# Altium footprint library ST封装.PcbLib: 1336 footprints (part 83 of 109)
Each footprint in its own frame and in the unit in brackets; x right, y up, seen from the top. Pads: shape width x height; smd on the part's side, far side on the other; paste and mask are expansions set on the pad; w line width, h text height; cw(c..) or ccw(c..) is an arc to the next point about the centre after c.
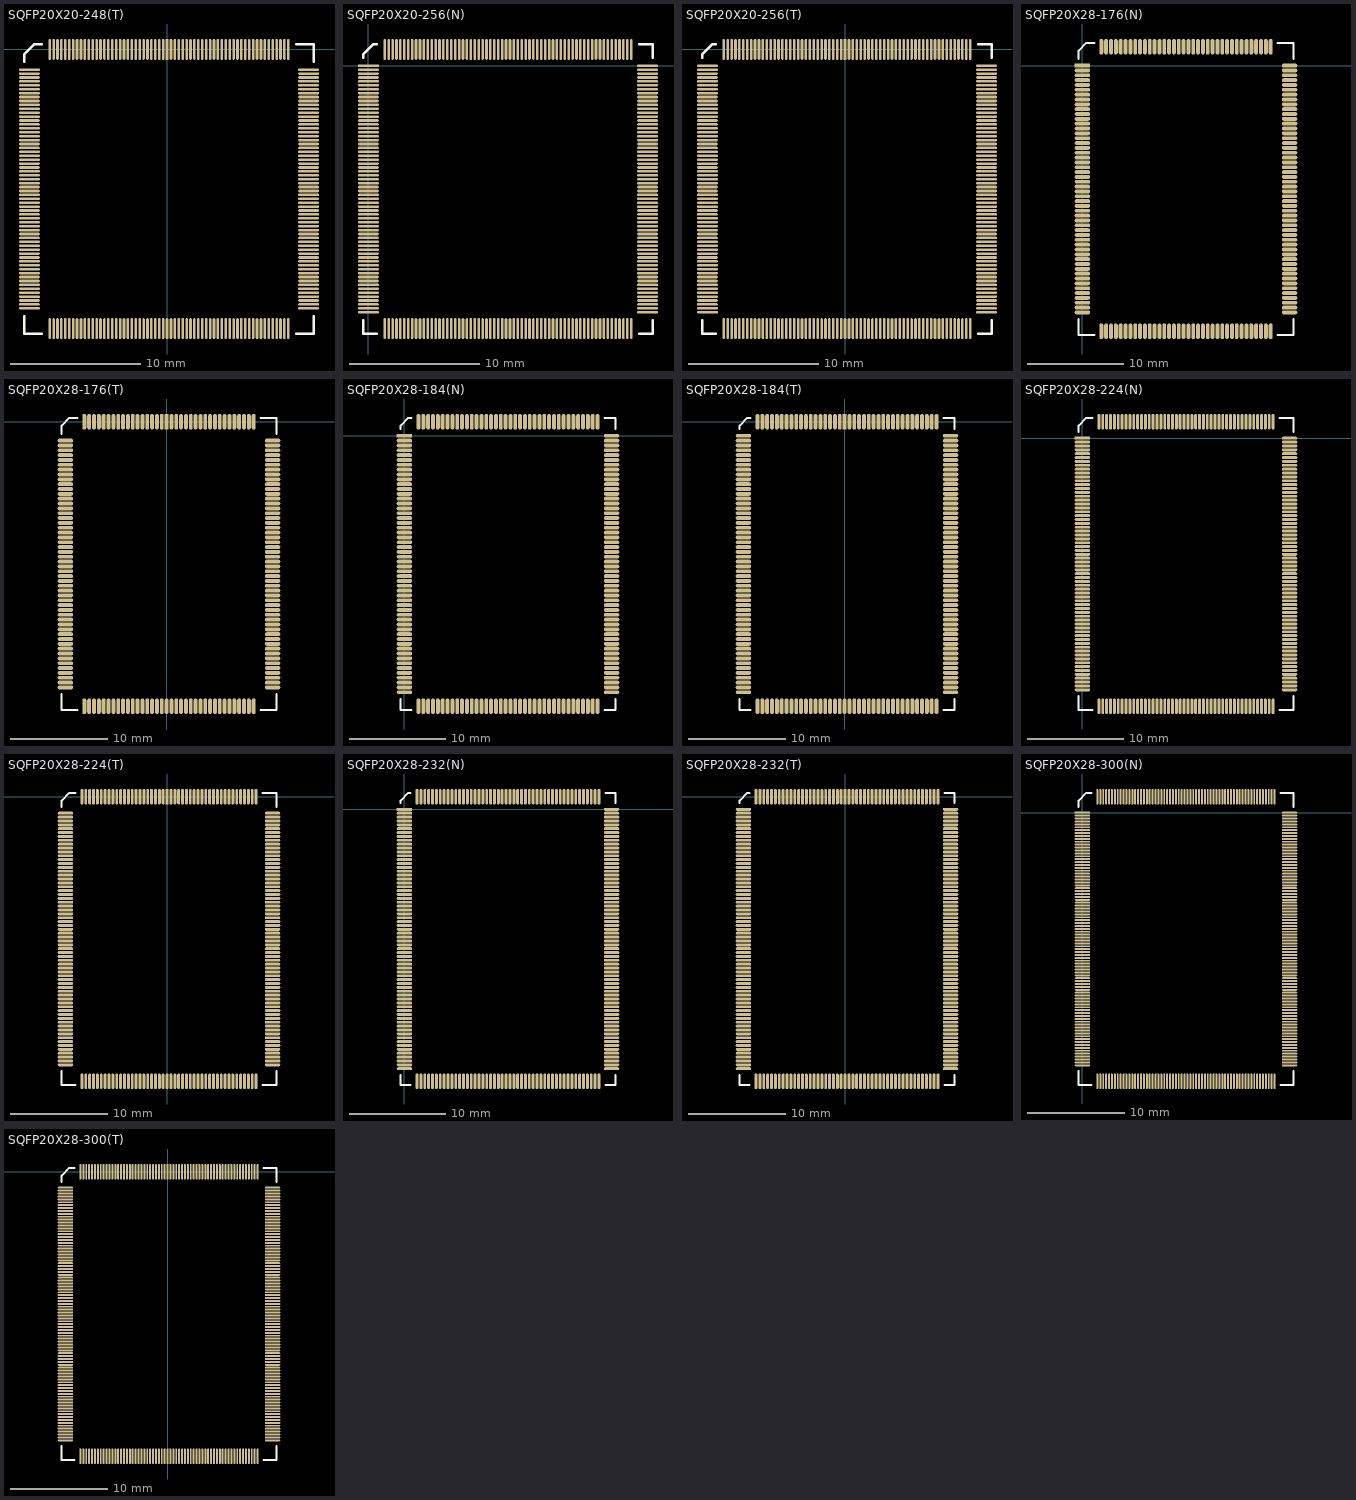
[diagram p82: the footprints below, top view; thin cyan lines are the x and y axes]

## SQFP20X20-248(T) [mm]
pads (248):
  rect 0.2x1.6 smd: 1(0,0)
  oval 0.2x1.6 smd: 2(-0.3,0) 3(-0.6,0) 4(-0.9,0) 5(-1.2,0) 6(-1.5,0) 7(-1.8,0) 8(-2.1,0) 9(-2.4,0) 10(-2.7,0) 11(-3,0) 12(-3.3,0) 13(-3.6,0) 14(-3.9,0) 15(-4.2,0) 16(-4.5,0) 17(-4.8,0) 18(-5.1,0) 19(-5.4,0) 20(-5.7,0) 21(-6,0) 22(-6.3,0) 23(-6.6,0) 24(-6.9,0) 25(-7.2,0) 26(-7.5,0) 27(-7.8,0) 28(-8.1,0) 29(-8.4,0) 30(-8.7,0) 31(-9,0) 94(-9,-21.4) 95(-8.7,-21.4) 96(-8.4,-21.4) 97(-8.1,-21.4) 98(-7.8,-21.4) 99(-7.5,-21.4) 100(-7.2,-21.4) 101(-6.9,-21.4) 102(-6.6,-21.4) 103(-6.3,-21.4) 104(-6,-21.4) 105(-5.7,-21.4) 106(-5.4,-21.4) 107(-5.1,-21.4) 108(-4.8,-21.4) 109(-4.5,-21.4) 110(-4.2,-21.4) 111(-3.9,-21.4) 112(-3.6,-21.4) 113(-3.3,-21.4) 114(-3,-21.4) 115(-2.7,-21.4) 116(-2.4,-21.4) 117(-2.1,-21.4) 118(-1.8,-21.4) 119(-1.5,-21.4) 120(-1.2,-21.4) 121(-0.9,-21.4) 122(-0.6,-21.4) 123(-0.3,-21.4) 124(0,-21.4) 125(0.3,-21.4) 126(0.6,-21.4) 127(0.9,-21.4) 128(1.2,-21.4) 129(1.5,-21.4) 130(1.8,-21.4) 131(2.1,-21.4) 132(2.4,-21.4) 133(2.7,-21.4) 134(3,-21.4) 135(3.3,-21.4) 136(3.6,-21.4) 137(3.9,-21.4) 138(4.2,-21.4) 139(4.5,-21.4) 140(4.8,-21.4) 141(5.1,-21.4) 142(5.4,-21.4) 143(5.7,-21.4) 144(6,-21.4) 145(6.3,-21.4) 146(6.6,-21.4) 147(6.9,-21.4) 148(7.2,-21.4) 149(7.5,-21.4) 150(7.8,-21.4) 151(8.1,-21.4) 152(8.4,-21.4) 153(8.7,-21.4) 154(9,-21.4) 155(9.3,-21.4) 218(9.3,0) 219(9,0) 220(8.7,0) 221(8.4,0) 222(8.1,0) 223(7.8,0) 224(7.5,0) 225(7.2,0) 226(6.9,0) 227(6.6,0) 228(6.3,0) 229(6,0) 230(5.7,0) 231(5.4,0) 232(5.1,0) 233(4.8,0) 234(4.5,0) 235(4.2,0) 236(3.9,0) 237(3.6,0) 238(3.3,0) 239(3,0) 240(2.7,0) 241(2.4,0) 242(2.1,0) 243(1.8,0) 244(1.5,0) 245(1.2,0) 246(0.9,0) 247(0.6,0) 248(0.3,0)
  oval 1.6x0.2 smd: 32(-10.55,-1.55) 33(-10.55,-1.85) 34(-10.55,-2.15) 35(-10.55,-2.45) 36(-10.55,-2.75) 37(-10.55,-3.05) 38(-10.55,-3.35) 39(-10.55,-3.65) 40(-10.55,-3.95) 41(-10.55,-4.25) 42(-10.55,-4.55) 43(-10.55,-4.85) 44(-10.55,-5.15) 45(-10.55,-5.45) 46(-10.55,-5.75) 47(-10.55,-6.05) 48(-10.55,-6.35) 49(-10.55,-6.65) 50(-10.55,-6.95) 51(-10.55,-7.25) 52(-10.55,-7.55) 53(-10.55,-7.85) 54(-10.55,-8.15) 55(-10.55,-8.45) 56(-10.55,-8.75) 57(-10.55,-9.05) 58(-10.55,-9.35) 59(-10.55,-9.65) 60(-10.55,-9.95) 61(-10.55,-10.25) 62(-10.55,-10.55) 63(-10.55,-10.85) 64(-10.55,-11.15) 65(-10.55,-11.45) 66(-10.55,-11.75) 67(-10.55,-12.05) 68(-10.55,-12.35) 69(-10.55,-12.65) 70(-10.55,-12.95) 71(-10.55,-13.25) 72(-10.55,-13.55) 73(-10.55,-13.85) 74(-10.55,-14.15) 75(-10.55,-14.45) 76(-10.55,-14.75) 77(-10.55,-15.05) 78(-10.55,-15.35) 79(-10.55,-15.65) 80(-10.55,-15.95) 81(-10.55,-16.25) 82(-10.55,-16.55) 83(-10.55,-16.85) 84(-10.55,-17.15) 85(-10.55,-17.45) 86(-10.55,-17.75) 87(-10.55,-18.05) 88(-10.55,-18.35) 89(-10.55,-18.65) 90(-10.55,-18.95) 91(-10.55,-19.25) 92(-10.55,-19.55) 93(-10.55,-19.85) 156(10.85,-19.85) 157(10.85,-19.55) 158(10.85,-19.25) 159(10.85,-18.95) 160(10.85,-18.65) 161(10.85,-18.35) 162(10.85,-18.05) 163(10.85,-17.75) 164(10.85,-17.45) 165(10.85,-17.15) 166(10.85,-16.85) 167(10.85,-16.55) 168(10.85,-16.25) 169(10.85,-15.95) 170(10.85,-15.65) 171(10.85,-15.35) 172(10.85,-15.05) 173(10.85,-14.75) 174(10.85,-14.45) 175(10.85,-14.15) 176(10.85,-13.85) 177(10.85,-13.55) 178(10.85,-13.25) 179(10.85,-12.95) 180(10.85,-12.65) 181(10.85,-12.35) 182(10.85,-12.05) 183(10.85,-11.75) 184(10.85,-11.45) 185(10.85,-11.15) 186(10.85,-10.85) 187(10.85,-10.55) 188(10.85,-10.25) 189(10.85,-9.95) 190(10.85,-9.65) 191(10.85,-9.35) 192(10.85,-9.05) 193(10.85,-8.75) 194(10.85,-8.45) 195(10.85,-8.15) 196(10.85,-7.85) 197(10.85,-7.55) 198(10.85,-7.25) 199(10.85,-6.95) 200(10.85,-6.65) 201(10.85,-6.35) 202(10.85,-6.05) 203(10.85,-5.75) 204(10.85,-5.45) 205(10.85,-5.15) 206(10.85,-4.85) 207(10.85,-4.55) 208(10.85,-4.25) 209(10.85,-3.95) 210(10.85,-3.65) 211(10.85,-3.35) 212(10.85,-3.05) 213(10.85,-2.75) 214(10.85,-2.45) 215(10.85,-2.15) 216(10.85,-1.85) 217(10.85,-1.55)
Top Overlay:
  lines w0.2: -10.95,-20.45 -10.95,-21.8 -9.6,-21.8 ; -10.95,-0.95 -10.95,-0.4 -10.15,0.4 -9.6,0.4 ; 9.9,-21.8 11.25,-21.8 11.25,-20.45 ; 9.9,0.4 11.25,0.4 11.25,-0.95

## SQFP20X20-256(N) [mm]
pads (256):
  rect 1.6x0.2 smd: 1(0,0)
  oval 1.6x0.2 smd: 2(0,-0.3) 3(0,-0.6) 4(0,-0.9) 5(0,-1.2) 6(0,-1.5) 7(0,-1.8) 8(0,-2.1) 9(0,-2.4) 10(0,-2.7) 11(0,-3) 12(0,-3.3) 13(0,-3.6) 14(0,-3.9) 15(0,-4.2) 16(0,-4.5) 17(0,-4.8) 18(0,-5.1) 19(0,-5.4) 20(0,-5.7) 21(0,-6) 22(0,-6.3) 23(0,-6.6) 24(0,-6.9) 25(0,-7.2) 26(0,-7.5) 27(0,-7.8) 28(0,-8.1) 29(0,-8.4) 30(0,-8.7) 31(0,-9) 32(0,-9.3) 33(0,-9.6) 34(0,-9.9) 35(0,-10.2) 36(0,-10.5) 37(0,-10.8) 38(0,-11.1) 39(0,-11.4) 40(0,-11.7) 41(0,-12) 42(0,-12.3) 43(0,-12.6) 44(0,-12.9) 45(0,-13.2) 46(0,-13.5) 47(0,-13.8) 48(0,-14.1) 49(0,-14.4) 50(0,-14.7) 51(0,-15) 52(0,-15.3) 53(0,-15.6) 54(0,-15.9) 55(0,-16.2) 56(0,-16.5) 57(0,-16.8) 58(0,-17.1) 59(0,-17.4) 60(0,-17.7) 61(0,-18) 62(0,-18.3) 63(0,-18.6) 64(0,-18.9) 129(21.4,-18.9) 130(21.4,-18.6) 131(21.4,-18.3) 132(21.4,-18) 133(21.4,-17.7) 134(21.4,-17.4) 135(21.4,-17.1) 136(21.4,-16.8) 137(21.4,-16.5) 138(21.4,-16.2) 139(21.4,-15.9) 140(21.4,-15.6) 141(21.4,-15.3) 142(21.4,-15) 143(21.4,-14.7) 144(21.4,-14.4) 145(21.4,-14.1) 146(21.4,-13.8) 147(21.4,-13.5) 148(21.4,-13.2) 149(21.4,-12.9) 150(21.4,-12.6) 151(21.4,-12.3) 152(21.4,-12) 153(21.4,-11.7) 154(21.4,-11.4) 155(21.4,-11.1) 156(21.4,-10.8) 157(21.4,-10.5) 158(21.4,-10.2) 159(21.4,-9.9) 160(21.4,-9.6) 161(21.4,-9.3) 162(21.4,-9) 163(21.4,-8.7) 164(21.4,-8.4) 165(21.4,-8.1) 166(21.4,-7.8) 167(21.4,-7.5) 168(21.4,-7.2) 169(21.4,-6.9) 170(21.4,-6.6) 171(21.4,-6.3) 172(21.4,-6) 173(21.4,-5.7) 174(21.4,-5.4) 175(21.4,-5.1) 176(21.4,-4.8) 177(21.4,-4.5) 178(21.4,-4.2) 179(21.4,-3.9) 180(21.4,-3.6) 181(21.4,-3.3) 182(21.4,-3) 183(21.4,-2.7) 184(21.4,-2.4) 185(21.4,-2.1) 186(21.4,-1.8) 187(21.4,-1.5) 188(21.4,-1.2) 189(21.4,-0.9) 190(21.4,-0.6) 191(21.4,-0.3) 192(21.4,0)
  oval 0.2x1.6 smd: 65(1.25,-20.15) 66(1.55,-20.15) 67(1.85,-20.15) 68(2.15,-20.15) 69(2.45,-20.15) 70(2.75,-20.15) 71(3.05,-20.15) 72(3.35,-20.15) 73(3.65,-20.15) 74(3.95,-20.15) 75(4.25,-20.15) 76(4.55,-20.15) 77(4.85,-20.15) 78(5.15,-20.15) 79(5.45,-20.15) 80(5.75,-20.15) 81(6.05,-20.15) 82(6.35,-20.15) 83(6.65,-20.15) 84(6.95,-20.15) 85(7.25,-20.15) 86(7.55,-20.15) 87(7.85,-20.15) 88(8.15,-20.15) 89(8.45,-20.15) 90(8.75,-20.15) 91(9.05,-20.15) 92(9.35,-20.15) 93(9.65,-20.15) 94(9.95,-20.15) 95(10.25,-20.15) 96(10.55,-20.15) 97(10.85,-20.15) 98(11.15,-20.15) 99(11.45,-20.15) 100(11.75,-20.15) 101(12.05,-20.15) 102(12.35,-20.15) 103(12.65,-20.15) 104(12.95,-20.15) 105(13.25,-20.15) 106(13.55,-20.15) 107(13.85,-20.15) 108(14.15,-20.15) 109(14.45,-20.15) 110(14.75,-20.15) 111(15.05,-20.15) 112(15.35,-20.15) 113(15.65,-20.15) 114(15.95,-20.15) 115(16.25,-20.15) 116(16.55,-20.15) 117(16.85,-20.15) 118(17.15,-20.15) 119(17.45,-20.15) 120(17.75,-20.15) 121(18.05,-20.15) 122(18.35,-20.15) 123(18.65,-20.15) 124(18.95,-20.15) 125(19.25,-20.15) 126(19.55,-20.15) 127(19.85,-20.15) 128(20.15,-20.15) 193(20.15,1.25) 194(19.85,1.25) 195(19.55,1.25) 196(19.25,1.25) 197(18.95,1.25) 198(18.65,1.25) 199(18.35,1.25) 200(18.05,1.25) 201(17.75,1.25) 202(17.45,1.25) 203(17.15,1.25) 204(16.85,1.25) 205(16.55,1.25) 206(16.25,1.25) 207(15.95,1.25) 208(15.65,1.25) 209(15.35,1.25) 210(15.05,1.25) 211(14.75,1.25) 212(14.45,1.25) 213(14.15,1.25) 214(13.85,1.25) 215(13.55,1.25) 216(13.25,1.25) 217(12.95,1.25) 218(12.65,1.25) 219(12.35,1.25) 220(12.05,1.25) 221(11.75,1.25) 222(11.45,1.25) 223(11.15,1.25) 224(10.85,1.25) 225(10.55,1.25) 226(10.25,1.25) 227(9.95,1.25) 228(9.65,1.25) 229(9.35,1.25) 230(9.05,1.25) 231(8.75,1.25) 232(8.45,1.25) 233(8.15,1.25) 234(7.85,1.25) 235(7.55,1.25) 236(7.25,1.25) 237(6.95,1.25) 238(6.65,1.25) 239(6.35,1.25) 240(6.05,1.25) 241(5.75,1.25) 242(5.45,1.25) 243(5.15,1.25) 244(4.85,1.25) 245(4.55,1.25) 246(4.25,1.25) 247(3.95,1.25) 248(3.65,1.25) 249(3.35,1.25) 250(3.05,1.25) 251(2.75,1.25) 252(2.45,1.25) 253(2.15,1.25) 254(1.85,1.25) 255(1.55,1.25) 256(1.25,1.25)
Top Overlay:
  lines w0.2: -0.4,-19.5 -0.4,-20.55 0.65,-20.55 ; -0.4,0.6 -0.4,0.85 0.4,1.65 0.65,1.65 ; 20.75,-20.55 21.8,-20.55 21.8,-19.5 ; 20.75,1.65 21.8,1.65 21.8,0.6

## SQFP20X20-256(T) [mm]
pads (256):
  rect 0.2x1.6 smd: 1(0,0)
  oval 0.2x1.6 smd: 2(-0.3,0) 3(-0.6,0) 4(-0.9,0) 5(-1.2,0) 6(-1.5,0) 7(-1.8,0) 8(-2.1,0) 9(-2.4,0) 10(-2.7,0) 11(-3,0) 12(-3.3,0) 13(-3.6,0) 14(-3.9,0) 15(-4.2,0) 16(-4.5,0) 17(-4.8,0) 18(-5.1,0) 19(-5.4,0) 20(-5.7,0) 21(-6,0) 22(-6.3,0) 23(-6.6,0) 24(-6.9,0) 25(-7.2,0) 26(-7.5,0) 27(-7.8,0) 28(-8.1,0) 29(-8.4,0) 30(-8.7,0) 31(-9,0) 32(-9.3,0) 97(-9.3,-21.4) 98(-9,-21.4) 99(-8.7,-21.4) 100(-8.4,-21.4) 101(-8.1,-21.4) 102(-7.8,-21.4) 103(-7.5,-21.4) 104(-7.2,-21.4) 105(-6.9,-21.4) 106(-6.6,-21.4) 107(-6.3,-21.4) 108(-6,-21.4) 109(-5.7,-21.4) 110(-5.4,-21.4) 111(-5.1,-21.4) 112(-4.8,-21.4) 113(-4.5,-21.4) 114(-4.2,-21.4) 115(-3.9,-21.4) 116(-3.6,-21.4) 117(-3.3,-21.4) 118(-3,-21.4) 119(-2.7,-21.4) 120(-2.4,-21.4) 121(-2.1,-21.4) 122(-1.8,-21.4) 123(-1.5,-21.4) 124(-1.2,-21.4) 125(-0.9,-21.4) 126(-0.6,-21.4) 127(-0.3,-21.4) 128(0,-21.4) 129(0.3,-21.4) 130(0.6,-21.4) 131(0.9,-21.4) 132(1.2,-21.4) 133(1.5,-21.4) 134(1.8,-21.4) 135(2.1,-21.4) 136(2.4,-21.4) 137(2.7,-21.4) 138(3,-21.4) 139(3.3,-21.4) 140(3.6,-21.4) 141(3.9,-21.4) 142(4.2,-21.4) 143(4.5,-21.4) 144(4.8,-21.4) 145(5.1,-21.4) 146(5.4,-21.4) 147(5.7,-21.4) 148(6,-21.4) 149(6.3,-21.4) 150(6.6,-21.4) 151(6.9,-21.4) 152(7.2,-21.4) 153(7.5,-21.4) 154(7.8,-21.4) 155(8.1,-21.4) 156(8.4,-21.4) 157(8.7,-21.4) 158(9,-21.4) 159(9.3,-21.4) 160(9.6,-21.4) 225(9.6,0) 226(9.3,0) 227(9,0) 228(8.7,0) 229(8.4,0) 230(8.1,0) 231(7.8,0) 232(7.5,0) 233(7.2,0) 234(6.9,0) 235(6.6,0) 236(6.3,0) 237(6,0) 238(5.7,0) 239(5.4,0) 240(5.1,0) 241(4.8,0) 242(4.5,0) 243(4.2,0) 244(3.9,0) 245(3.6,0) 246(3.3,0) 247(3,0) 248(2.7,0) 249(2.4,0) 250(2.1,0) 251(1.8,0) 252(1.5,0) 253(1.2,0) 254(0.9,0) 255(0.6,0) 256(0.3,0)
  oval 1.6x0.2 smd: 33(-10.55,-1.25) 34(-10.55,-1.55) 35(-10.55,-1.85) 36(-10.55,-2.15) 37(-10.55,-2.45) 38(-10.55,-2.75) 39(-10.55,-3.05) 40(-10.55,-3.35) 41(-10.55,-3.65) 42(-10.55,-3.95) 43(-10.55,-4.25) 44(-10.55,-4.55) 45(-10.55,-4.85) 46(-10.55,-5.15) 47(-10.55,-5.45) 48(-10.55,-5.75) 49(-10.55,-6.05) 50(-10.55,-6.35) 51(-10.55,-6.65) 52(-10.55,-6.95) 53(-10.55,-7.25) 54(-10.55,-7.55) 55(-10.55,-7.85) 56(-10.55,-8.15) 57(-10.55,-8.45) 58(-10.55,-8.75) 59(-10.55,-9.05) 60(-10.55,-9.35) 61(-10.55,-9.65) 62(-10.55,-9.95) 63(-10.55,-10.25) 64(-10.55,-10.55) 65(-10.55,-10.85) 66(-10.55,-11.15) 67(-10.55,-11.45) 68(-10.55,-11.75) 69(-10.55,-12.05) 70(-10.55,-12.35) 71(-10.55,-12.65) 72(-10.55,-12.95) 73(-10.55,-13.25) 74(-10.55,-13.55) 75(-10.55,-13.85) 76(-10.55,-14.15) 77(-10.55,-14.45) 78(-10.55,-14.75) 79(-10.55,-15.05) 80(-10.55,-15.35) 81(-10.55,-15.65) 82(-10.55,-15.95) 83(-10.55,-16.25) 84(-10.55,-16.55) 85(-10.55,-16.85) 86(-10.55,-17.15) 87(-10.55,-17.45) 88(-10.55,-17.75) 89(-10.55,-18.05) 90(-10.55,-18.35) 91(-10.55,-18.65) 92(-10.55,-18.95) 93(-10.55,-19.25) 94(-10.55,-19.55) 95(-10.55,-19.85) 96(-10.55,-20.15) 161(10.85,-20.15) 162(10.85,-19.85) 163(10.85,-19.55) 164(10.85,-19.25) 165(10.85,-18.95) 166(10.85,-18.65) 167(10.85,-18.35) 168(10.85,-18.05) 169(10.85,-17.75) 170(10.85,-17.45) 171(10.85,-17.15) 172(10.85,-16.85) 173(10.85,-16.55) 174(10.85,-16.25) 175(10.85,-15.95) 176(10.85,-15.65) 177(10.85,-15.35) 178(10.85,-15.05) 179(10.85,-14.75) 180(10.85,-14.45) 181(10.85,-14.15) 182(10.85,-13.85) 183(10.85,-13.55) 184(10.85,-13.25) 185(10.85,-12.95) 186(10.85,-12.65) 187(10.85,-12.35) 188(10.85,-12.05) 189(10.85,-11.75) 190(10.85,-11.45) 191(10.85,-11.15) 192(10.85,-10.85) 193(10.85,-10.55) 194(10.85,-10.25) 195(10.85,-9.95) 196(10.85,-9.65) 197(10.85,-9.35) 198(10.85,-9.05) 199(10.85,-8.75) 200(10.85,-8.45) 201(10.85,-8.15) 202(10.85,-7.85) 203(10.85,-7.55) 204(10.85,-7.25) 205(10.85,-6.95) 206(10.85,-6.65) 207(10.85,-6.35) 208(10.85,-6.05) 209(10.85,-5.75) 210(10.85,-5.45) 211(10.85,-5.15) 212(10.85,-4.85) 213(10.85,-4.55) 214(10.85,-4.25) 215(10.85,-3.95) 216(10.85,-3.65) 217(10.85,-3.35) 218(10.85,-3.05) 219(10.85,-2.75) 220(10.85,-2.45) 221(10.85,-2.15) 222(10.85,-1.85) 223(10.85,-1.55) 224(10.85,-1.25)
Top Overlay:
  lines w0.2: -10.95,-20.75 -10.95,-21.8 -9.9,-21.8 ; -10.95,-0.65 -10.95,-0.4 -10.15,0.4 -9.9,0.4 ; 10.2,-21.8 11.25,-21.8 11.25,-20.75 ; 10.2,0.4 11.25,0.4 11.25,-0.65

## SQFP20X28-176(N) [mm]
pads (176):
  rect 1.6x0.4 smd: 1(0,0)
  oval 1.6x0.4 smd: 2(0,-0.5) 3(0,-1) 4(0,-1.5) 5(0,-2) 6(0,-2.5) 7(0,-3) 8(0,-3.5) 9(0,-4) 10(0,-4.5) 11(0,-5) 12(0,-5.5) 13(0,-6) 14(0,-6.5) 15(0,-7) 16(0,-7.5) 17(0,-8) 18(0,-8.5) 19(0,-9) 20(0,-9.5) 21(0,-10) 22(0,-10.5) 23(0,-11) 24(0,-11.5) 25(0,-12) 26(0,-12.5) 27(0,-13) 28(0,-13.5) 29(0,-14) 30(0,-14.5) 31(0,-15) 32(0,-15.5) 33(0,-16) 34(0,-16.5) 35(0,-17) 36(0,-17.5) 37(0,-18) 38(0,-18.5) 39(0,-19) 40(0,-19.5) 41(0,-20) 42(0,-20.5) 43(0,-21) 44(0,-21.5) 45(0,-22) 46(0,-22.5) 47(0,-23) 48(0,-23.5) 49(0,-24) 50(0,-24.5) 51(0,-25) 52(0,-25.5) 89(21.4,-25.5) 90(21.4,-25) 91(21.4,-24.5) 92(21.4,-24) 93(21.4,-23.5) 94(21.4,-23) 95(21.4,-22.5) 96(21.4,-22) 97(21.4,-21.5) 98(21.4,-21) 99(21.4,-20.5) 100(21.4,-20) 101(21.4,-19.5) 102(21.4,-19) 103(21.4,-18.5) 104(21.4,-18) 105(21.4,-17.5) 106(21.4,-17) 107(21.4,-16.5) 108(21.4,-16) 109(21.4,-15.5) 110(21.4,-15) 111(21.4,-14.5) 112(21.4,-14) 113(21.4,-13.5) 114(21.4,-13) 115(21.4,-12.5) 116(21.4,-12) 117(21.4,-11.5) 118(21.4,-11) 119(21.4,-10.5) 120(21.4,-10) 121(21.4,-9.5) 122(21.4,-9) 123(21.4,-8.5) 124(21.4,-8) 125(21.4,-7.5) 126(21.4,-7) 127(21.4,-6.5) 128(21.4,-6) 129(21.4,-5.5) 130(21.4,-5) 131(21.4,-4.5) 132(21.4,-4) 133(21.4,-3.5) 134(21.4,-3) 135(21.4,-2.5) 136(21.4,-2) 137(21.4,-1.5) 138(21.4,-1) 139(21.4,-0.5) 140(21.4,0)
  oval 0.4x1.6 smd: 53(1.95,-27.45) 54(2.45,-27.45) 55(2.95,-27.45) 56(3.45,-27.45) 57(3.95,-27.45) 58(4.45,-27.45) 59(4.95,-27.45) 60(5.45,-27.45) 61(5.95,-27.45) 62(6.45,-27.45) 63(6.95,-27.45) 64(7.45,-27.45) 65(7.95,-27.45) 66(8.45,-27.45) 67(8.95,-27.45) 68(9.45,-27.45) 69(9.95,-27.45) 70(10.45,-27.45) 71(10.95,-27.45) 72(11.45,-27.45) 73(11.95,-27.45) 74(12.45,-27.45) 75(12.95,-27.45) 76(13.45,-27.45) 77(13.95,-27.45) 78(14.45,-27.45) 79(14.95,-27.45) 80(15.45,-27.45) 81(15.95,-27.45) 82(16.45,-27.45) 83(16.95,-27.45) 84(17.45,-27.45) 85(17.95,-27.45) 86(18.45,-27.45) 87(18.95,-27.45) 88(19.45,-27.45) 141(19.45,1.95) 142(18.95,1.95) 143(18.45,1.95) 144(17.95,1.95) 145(17.45,1.95) 146(16.95,1.95) 147(16.45,1.95) 148(15.95,1.95) 149(15.45,1.95) 150(14.95,1.95) 151(14.45,1.95) 152(13.95,1.95) 153(13.45,1.95) 154(12.95,1.95) 155(12.45,1.95) 156(11.95,1.95) 157(11.45,1.95) 158(10.95,1.95) 159(10.45,1.95) 160(9.95,1.95) 161(9.45,1.95) 162(8.95,1.95) 163(8.45,1.95) 164(7.95,1.95) 165(7.45,1.95) 166(6.95,1.95) 167(6.45,1.95) 168(5.95,1.95) 169(5.45,1.95) 170(4.95,1.95) 171(4.45,1.95) 172(3.95,1.95) 173(3.45,1.95) 174(2.95,1.95) 175(2.45,1.95) 176(1.95,1.95)
Top Overlay:
  lines w0.2: -0.4,-26.2 -0.4,-27.85 1.25,-27.85 ; -0.4,0.7 -0.4,1.55 0.4,2.35 1.25,2.35 ; 20.15,-27.85 21.8,-27.85 21.8,-26.2 ; 20.15,2.35 21.8,2.35 21.8,0.7

## SQFP20X28-176(T) [mm]
pads (176):
  rect 0.4x1.6 smd: 1(0,0)
  oval 0.4x1.6 smd: 2(-0.5,0) 3(-1,0) 4(-1.5,0) 5(-2,0) 6(-2.5,0) 7(-3,0) 8(-3.5,0) 9(-4,0) 10(-4.5,0) 11(-5,0) 12(-5.5,0) 13(-6,0) 14(-6.5,0) 15(-7,0) 16(-7.5,0) 17(-8,0) 18(-8.5,0) 71(-8.5,-29.4) 72(-8,-29.4) 73(-7.5,-29.4) 74(-7,-29.4) 75(-6.5,-29.4) 76(-6,-29.4) 77(-5.5,-29.4) 78(-5,-29.4) 79(-4.5,-29.4) 80(-4,-29.4) 81(-3.5,-29.4) 82(-3,-29.4) 83(-2.5,-29.4) 84(-2,-29.4) 85(-1.5,-29.4) 86(-1,-29.4) 87(-0.5,-29.4) 88(0,-29.4) 89(0.5,-29.4) 90(1,-29.4) 91(1.5,-29.4) 92(2,-29.4) 93(2.5,-29.4) 94(3,-29.4) 95(3.5,-29.4) 96(4,-29.4) 97(4.5,-29.4) 98(5,-29.4) 99(5.5,-29.4) 100(6,-29.4) 101(6.5,-29.4) 102(7,-29.4) 103(7.5,-29.4) 104(8,-29.4) 105(8.5,-29.4) 106(9,-29.4) 159(9,0) 160(8.5,0) 161(8,0) 162(7.5,0) 163(7,0) 164(6.5,0) 165(6,0) 166(5.5,0) 167(5,0) 168(4.5,0) 169(4,0) 170(3.5,0) 171(3,0) 172(2.5,0) 173(2,0) 174(1.5,0) 175(1,0) 176(0.5,0)
  oval 1.6x0.4 smd: 19(-10.45,-1.95) 20(-10.45,-2.45) 21(-10.45,-2.95) 22(-10.45,-3.45) 23(-10.45,-3.95) 24(-10.45,-4.45) 25(-10.45,-4.95) 26(-10.45,-5.45) 27(-10.45,-5.95) 28(-10.45,-6.45) 29(-10.45,-6.95) 30(-10.45,-7.45) 31(-10.45,-7.95) 32(-10.45,-8.45) 33(-10.45,-8.95) 34(-10.45,-9.45) 35(-10.45,-9.95) 36(-10.45,-10.45) 37(-10.45,-10.95) 38(-10.45,-11.45) 39(-10.45,-11.95) 40(-10.45,-12.45) 41(-10.45,-12.95) 42(-10.45,-13.45) 43(-10.45,-13.95) 44(-10.45,-14.45) 45(-10.45,-14.95) 46(-10.45,-15.45) 47(-10.45,-15.95) 48(-10.45,-16.45) 49(-10.45,-16.95) 50(-10.45,-17.45) 51(-10.45,-17.95) 52(-10.45,-18.45) 53(-10.45,-18.95) 54(-10.45,-19.45) 55(-10.45,-19.95) 56(-10.45,-20.45) 57(-10.45,-20.95) 58(-10.45,-21.45) 59(-10.45,-21.95) 60(-10.45,-22.45) 61(-10.45,-22.95) 62(-10.45,-23.45) 63(-10.45,-23.95) 64(-10.45,-24.45) 65(-10.45,-24.95) 66(-10.45,-25.45) 67(-10.45,-25.95) 68(-10.45,-26.45) 69(-10.45,-26.95) 70(-10.45,-27.45) 107(10.95,-27.45) 108(10.95,-26.95) 109(10.95,-26.45) 110(10.95,-25.95) 111(10.95,-25.45) 112(10.95,-24.95) 113(10.95,-24.45) 114(10.95,-23.95) 115(10.95,-23.45) 116(10.95,-22.95) 117(10.95,-22.45) 118(10.95,-21.95) 119(10.95,-21.45) 120(10.95,-20.95) 121(10.95,-20.45) 122(10.95,-19.95) 123(10.95,-19.45) 124(10.95,-18.95) 125(10.95,-18.45) 126(10.95,-17.95) 127(10.95,-17.45) 128(10.95,-16.95) 129(10.95,-16.45) 130(10.95,-15.95) 131(10.95,-15.45) 132(10.95,-14.95) 133(10.95,-14.45) 134(10.95,-13.95) 135(10.95,-13.45) 136(10.95,-12.95) 137(10.95,-12.45) 138(10.95,-11.95) 139(10.95,-11.45) 140(10.95,-10.95) 141(10.95,-10.45) 142(10.95,-9.95) 143(10.95,-9.45) 144(10.95,-8.95) 145(10.95,-8.45) 146(10.95,-7.95) 147(10.95,-7.45) 148(10.95,-6.95) 149(10.95,-6.45) 150(10.95,-5.95) 151(10.95,-5.45) 152(10.95,-4.95) 153(10.95,-4.45) 154(10.95,-3.95) 155(10.95,-3.45) 156(10.95,-2.95) 157(10.95,-2.45) 158(10.95,-1.95)
Top Overlay:
  lines w0.2: -10.85,-28.15 -10.85,-29.8 -9.2,-29.8 ; -10.85,-1.25 -10.85,-0.4 -10.05,0.4 -9.2,0.4 ; 9.7,-29.8 11.35,-29.8 11.35,-28.15 ; 9.7,0.4 11.35,0.4 11.35,-1.25

## SQFP20X28-184(N) [mm]
pads (184):
  rect 1.6x0.4 smd: 1(0,0)
  oval 1.6x0.4 smd: 2(0,-0.5) 3(0,-1) 4(0,-1.5) 5(0,-2) 6(0,-2.5) 7(0,-3) 8(0,-3.5) 9(0,-4) 10(0,-4.5) 11(0,-5) 12(0,-5.5) 13(0,-6) 14(0,-6.5) 15(0,-7) 16(0,-7.5) 17(0,-8) 18(0,-8.5) 19(0,-9) 20(0,-9.5) 21(0,-10) 22(0,-10.5) 23(0,-11) 24(0,-11.5) 25(0,-12) 26(0,-12.5) 27(0,-13) 28(0,-13.5) 29(0,-14) 30(0,-14.5) 31(0,-15) 32(0,-15.5) 33(0,-16) 34(0,-16.5) 35(0,-17) 36(0,-17.5) 37(0,-18) 38(0,-18.5) 39(0,-19) 40(0,-19.5) 41(0,-20) 42(0,-20.5) 43(0,-21) 44(0,-21.5) 45(0,-22) 46(0,-22.5) 47(0,-23) 48(0,-23.5) 49(0,-24) 50(0,-24.5) 51(0,-25) 52(0,-25.5) 53(0,-26) 54(0,-26.5) 93(21.4,-26.5) 94(21.4,-26) 95(21.4,-25.5) 96(21.4,-25) 97(21.4,-24.5) 98(21.4,-24) 99(21.4,-23.5) 100(21.4,-23) 101(21.4,-22.5) 102(21.4,-22) 103(21.4,-21.5) 104(21.4,-21) 105(21.4,-20.5) 106(21.4,-20) 107(21.4,-19.5) 108(21.4,-19) 109(21.4,-18.5) 110(21.4,-18) 111(21.4,-17.5) 112(21.4,-17) 113(21.4,-16.5) 114(21.4,-16) 115(21.4,-15.5) 116(21.4,-15) 117(21.4,-14.5) 118(21.4,-14) 119(21.4,-13.5) 120(21.4,-13) 121(21.4,-12.5) 122(21.4,-12) 123(21.4,-11.5) 124(21.4,-11) 125(21.4,-10.5) 126(21.4,-10) 127(21.4,-9.5) 128(21.4,-9) 129(21.4,-8.5) 130(21.4,-8) 131(21.4,-7.5) 132(21.4,-7) 133(21.4,-6.5) 134(21.4,-6) 135(21.4,-5.5) 136(21.4,-5) 137(21.4,-4.5) 138(21.4,-4) 139(21.4,-3.5) 140(21.4,-3) 141(21.4,-2.5) 142(21.4,-2) 143(21.4,-1.5) 144(21.4,-1) 145(21.4,-0.5) 146(21.4,0)
  oval 0.4x1.6 smd: 55(1.45,-27.95) 56(1.95,-27.95) 57(2.45,-27.95) 58(2.95,-27.95) 59(3.45,-27.95) 60(3.95,-27.95) 61(4.45,-27.95) 62(4.95,-27.95) 63(5.45,-27.95) 64(5.95,-27.95) 65(6.45,-27.95) 66(6.95,-27.95) 67(7.45,-27.95) 68(7.95,-27.95) 69(8.45,-27.95) 70(8.95,-27.95) 71(9.45,-27.95) 72(9.95,-27.95) 73(10.45,-27.95) 74(10.95,-27.95) 75(11.45,-27.95) 76(11.95,-27.95) 77(12.45,-27.95) 78(12.95,-27.95) 79(13.45,-27.95) 80(13.95,-27.95) 81(14.45,-27.95) 82(14.95,-27.95) 83(15.45,-27.95) 84(15.95,-27.95) 85(16.45,-27.95) 86(16.95,-27.95) 87(17.45,-27.95) 88(17.95,-27.95) 89(18.45,-27.95) 90(18.95,-27.95) 91(19.45,-27.95) 92(19.95,-27.95) 147(19.95,1.45) 148(19.45,1.45) 149(18.95,1.45) 150(18.45,1.45) 151(17.95,1.45) 152(17.45,1.45) 153(16.95,1.45) 154(16.45,1.45) 155(15.95,1.45) 156(15.45,1.45) 157(14.95,1.45) 158(14.45,1.45) 159(13.95,1.45) 160(13.45,1.45) 161(12.95,1.45) 162(12.45,1.45) 163(11.95,1.45) 164(11.45,1.45) 165(10.95,1.45) 166(10.45,1.45) 167(9.95,1.45) 168(9.45,1.45) 169(8.95,1.45) 170(8.45,1.45) 171(7.95,1.45) 172(7.45,1.45) 173(6.95,1.45) 174(6.45,1.45) 175(5.95,1.45) 176(5.45,1.45) 177(4.95,1.45) 178(4.45,1.45) 179(3.95,1.45) 180(3.45,1.45) 181(2.95,1.45) 182(2.45,1.45) 183(1.95,1.45) 184(1.45,1.45)
Top Overlay:
  lines w0.2: -0.4,-27.2 -0.4,-28.35 0.75,-28.35 ; -0.4,0.7 -0.4,1.05 0.4,1.85 0.75,1.85 ; 20.65,-28.35 21.8,-28.35 21.8,-27.2 ; 20.65,1.85 21.8,1.85 21.8,0.7
